# Altium footprint library conn_others.PcbLib: 26 footprints (part 1 of 2)
Each footprint in its own frame and in the unit in brackets; x right, y up, seen from the top. Pads: shape width x height; smd on the part's side, far side on the other; paste and mask are expansions set on the pad; w line width, h text height; cw(c..) or ccw(c..) is an arc to the next point about the centre after c.
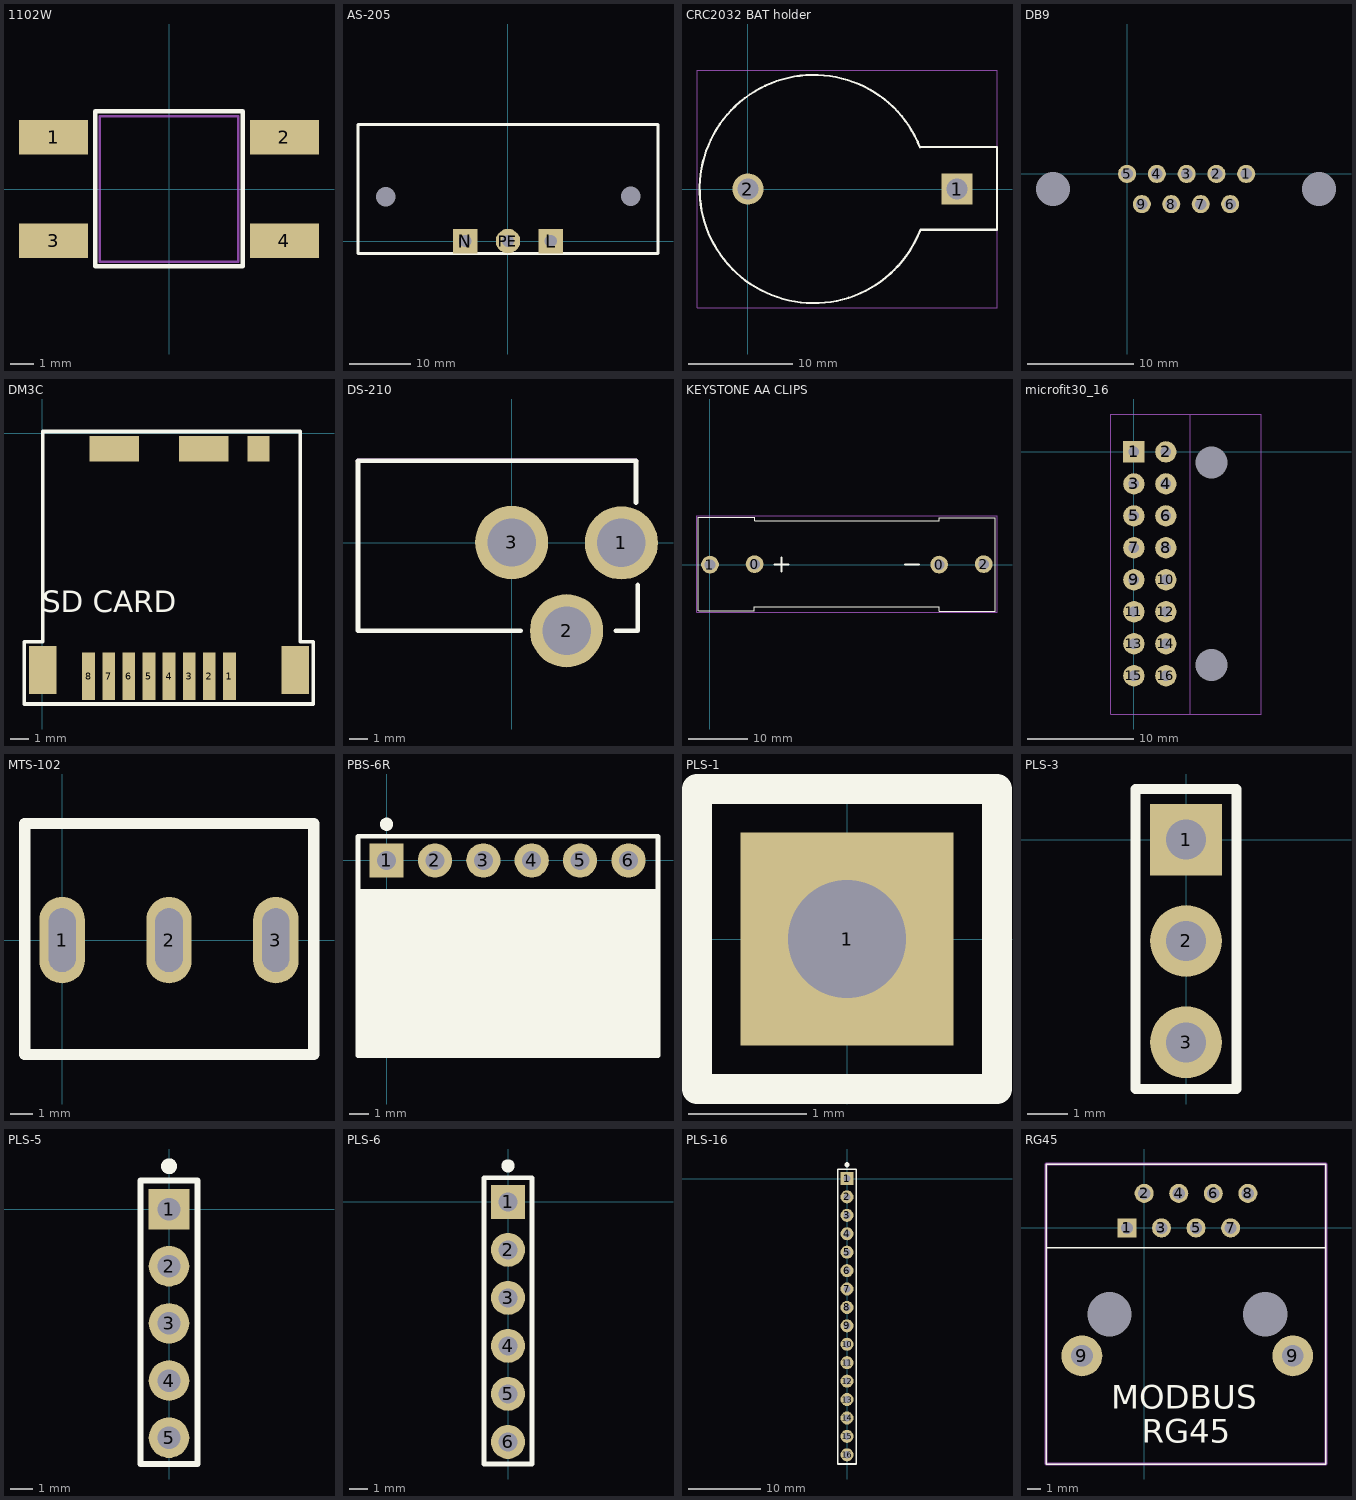
[diagram p0: the footprints below, top view; thin cyan lines are the x and y axes]

## 1102W [mm]
height 6
pads (4):
  rect 3x1.5 smd: 1(-5,2.25) 2(5,2.25) 3(-5,-2.25) 4(5,-2.25)
Top Overlay:
  lines w0.2: -3.2,-3.35 3.2,-3.35 3.2,3.375 -3.2,3.375 -3.2,-3.35
Mechanical 15:
  lines w0.1: -3,-3.15 3,-3.15 3,3.15 -3,3.15 -3,-3.15
3D body "TACT SMD 6X6.step": height 5, standoff 0, extent -5,-3 5,3

## AS-205 [mm]
height 30
pads (5):
  rect 4x4 hole 2: L(7,0) N(-7,0)
  round 0 hole 3.2 unplated mask+1.7: NPTH(-19.983,7.264) NPTH(20.022,7.289)
  round 4 hole 2: PE(0,0)
Top Overlay:
  lines w0.5: -24.5,-2 -24.5,19 24.5,19 24.5,-2 -24.5,-2
3D body "AS-205.STEP": height 26.8, standoff -3.8, extent -24.5,-2 24.5,19

## CRC2032 BAT holder [mm]
pads (2):
  rect 3x3 hole 2: 1(20,0)
  round 3 hole 2: 2(0,0)
Top Overlay:
  lines w0.2: 16.466,3.987 ccw(c6.3,0) 16.5,-3.9 23.825,-3.9 23.825,4 16.5,4
Mechanical 29:
  lines w0.1: -4.875,-11.375 -4.875,11.375 23.825,11.375 23.825,-11.375 -4.875,-11.375
  text ".Designator" at 4.3,5.4 h1
3D body "CR 2032 Battery Holder.step": height 6.55, standoff -4, extent -4.875,-11.375 23.825,11.375

## DB9 [mm] "разьем COM232"
pads (11):
  round 1.7 hole 1.1: 1(11.2,0) 2(8.4,0) 3(5.6,0) 4(2.8,0) 5(0,0) 6(9.695,-2.84) 7(6.925,-2.84) 8(4.155,-2.84) 9(1.385,-2.84)
  round 0 hole 3.2 unplated mask+1.7: NPTH(-6.96,-1.42) NPTH(18.04,-1.42)
3D body "db9f-2.step": height 13.28, standoff -3.15, extent -9.791,-16.867 21.009,1.533

## DM3C [mm] "Держатель карты MicroSD на плату"
height 1
pads (13):
  rect 0.7x2.6 smd: 1(10.222,-13.288) 2(9.122,-13.288) 3(8.022,-13.288) 4(6.922,-13.288) 5(5.822,-13.288) 6(4.722,-13.288) 7(3.622,-13.288) 8(2.522,-13.288)
  rect 1.5x2.6 smd: ""(0.019,-12.942) ""(13.819,-12.942)
  rect 2.7x1.4 smd: ""(3.919,-0.842) ""(8.819,-0.842)
  rect 1.2x1.4 smd: ""(11.819,-0.842)
Top Overlay:
  lines w0.2: -1,-14.8 -1,-11.4 ; -0.983,-14.8 14.8,-14.8 14.8,-11.4 14.1,-11.4 14.1,0.1 0.019,0.1 0.019,-11.4 ; -0.983,-11.4 0,-11.4
  text "SD CARD" at 0,-10.16 h2
3D body "31785.stp": height 1.98, standoff 0.05, extent 0.3,-14.4 14.1,-0.3

## DS-210 [mm]
pads (3):
  round 4 hole 2.65: 1(6,0) 2(3,-4.8) 3(0,0.025)
Top Overlay:
  lines w0.254: 0.5,-4.8 -8.4,-4.8 -8.4,4.5 6.8,4.5 6.8,2.2 ; 5.7,-4.8 6.9,-4.8 6.9,-2.3
Mechanical 29:
  lines w0.25: -8.4,4.5 6.8,4.5
3D body "PowerJackFemale.STEP": height 11, standoff -3.5, extent -8.55,-4.756 6.75,4.6

## KEYSTONE AA CLIPS [mm]
pads (4):
  round 3 hole 1.8: 0(7.55,0.081) 0(38.8,0) 1(0,0) 2(46.35,0.081)
Top Overlay:
  lines w0.2: -1.964,-7.799 -1.964,8 7.6,8 7.6,7.4 38.8,7.4 38.8,7.9 48.3,7.9 48.3,-7.9 38.8,-7.9 38.8,-7.1 7.5,-7.1 7.5,-7.8 -1.9,-7.8
  lines w0.3: 10.9,0 13.3,0 ; 12.1,-1.2 12.1,1.2 ; 33,0 35.4,0
Mechanical 29:
  lines w0.1: -2.2,-8.1 48.6,-8.1 48.6,8.3 -2.2,8.3 -2.2,-8.1
  text ".Designator" at 18.8,0.7 h1.5
3D body "duracell ultra aa 1_5v mx 1500 lr6.step": height 17.25, standoff 2.75, extent -2,-7.101 48.25,7.4
3D body "AA batery clip keystone 2915 .step": height 16.69, standoff -4.02, extent -1.964,-7.799 7.55,7.961
3D body "AA batery clip keystone 2915 .step": height 16.69, standoff -4.02, extent 38.786,-7.88 48.3,7.88

## microfit30_16 [mm]
pads (18):
  round 0 hole 3 unplated: 0(7.29,-19.99) 0(7.29,-1.016)
  rect 2x2 hole 1: 1(0,0)
  round 2 hole 1: 2(3,0) 3(0,-3) 4(3,-3) 5(0,-6) 6(3,-6) 7(0,-9) 8(3,-9) 9(0,-12) 10(3,-12) 11(0,-15) 12(3,-15) 13(0,-18) 14(3,-18) 15(0,-21) 16(3,-21)
Mechanical 29:
  lines w0.1: 4.826,3.556 5.283,3.556 5.283,-24.594 5.817,-24.594 ; -2.159,-24.594 11.937,-24.594 11.937,3.556 -2.159,3.556 -2.159,-24.594
  text ".Designator" at 9.703,-0.127 h1.5
3D body "header-16 R PCB.stp": height 8.83, standoff -3.12, extent -0.303,-24.594 11.937,3.556

## MTS-102 [mm]
height 10
pads (3):
  oval 2x3.8 hole 1.2 slot 2.8 at 90 deg: 1(0,0) 2(4.7,0) 3(9.4,0)
Top Overlay:
  lines w0.5: -1.651,-5.029 -1.651,5.131 11.063,5.131 11.063,-5.029 -1.651,-5.029
3D body "toogle_switch.STEP": height 28.55, standoff -3.83, extent -1.651,-5.029 11.063,5.131

## PBS-6R [mm] "Розетка угловая на плату 2,54мм"
pads (6):
  rect 1.8x1.8 hole 1: 1(0,0)
  round 1.8 hole 1: 2(2.54,0) 3(5.08,0) 4(7.62,0) 5(10.16,0) 6(12.7,0)
Top Overlay:
  circle w0.5: c0,1.9 r0.1
  rectangle: -1.5,-10.25 14.25,-1.5
  lines w0.254: -1.5,-10.25 14.25,-10.25 14.25,1.27 -1.5,1.27 -1.5,-10.25
3D body "PBS-6R.STEP": height 2.77, standoff -3.2, extent -1.585,-10.253 14.235,0.247

## PLS-1 [mm]
pads (1):
  rect 1.8x1.8 hole 1: 1(0,0)
Top Overlay:
  lines w0.254: -1.27,-1.27 -1.27,1.27 1.27,1.27 1.27,-1.27 -1.27,-1.27
3D body "PLS-1.step": height 8.44, standoff -3, extent -1.27,-1.27 1.27,1.27

## PLS-3 [mm]
pads (3):
  rect 1.8x1.8 hole 1: 1(0,0)
  round 1.8 hole 1: 2(0,-2.54) 3(0,-5.08)
Top Overlay:
  lines w0.254: -1.27,-6.25 1.27,-6.25 1.27,1.27 -1.27,1.27 -1.27,-6.25
Mechanical 29:
  lines w0.2: -1.27,-6.25 -1.27,1.27 1.27,1.27 1.27,-6.25 -1.27,-6.25
  text ".Designator" at 1.829,-0.254 h1
3D body "PLS-1.step": height 8.44, standoff -3, extent -1.27,-6.35 1.27,-3.81
3D body "PLS-1.step": height 8.44, standoff -3, extent -1.27,-3.81 1.27,-1.27
3D body "PLS-1.step": height 8.44, standoff -3, extent -1.27,-1.27 1.27,1.27

## PLS-5 [mm]
pads (5):
  rect 1.8x1.8 hole 1: 1(0,0)
  round 1.8 hole 1: 2(0,-2.54) 3(0,-5.08) 4(0,-7.62) 5(0,-10.16)
Top Overlay:
  circle w0.5: c0,1.9 r0.1
  lines w0.254: -1.27,-11.33 1.27,-11.33 1.27,1.27 -1.27,1.27 -1.27,-11.325
3D body "PLS-1.step": height 8.44, standoff -3, extent -1.27,-6.35 1.27,-3.81
3D body "PLS-1.step": height 8.44, standoff -3, extent -1.27,-3.81 1.27,-1.27
3D body "PLS-1.step": height 8.44, standoff -3, extent -1.27,-1.27 1.27,1.27
3D body "PLS-1.step": height 8.44, standoff -3, extent -1.27,-8.89 1.27,-6.35
3D body "PLS-1.step": height 8.44, standoff -3, extent -1.27,-11.43 1.27,-8.89

## PLS-6 [mm]
pads (6):
  rect 1.8x1.8 hole 1: 1(0,0)
  round 1.8 hole 1: 2(0,-2.54) 3(0,-5.08) 4(0,-7.62) 5(0,-10.16) 6(0,-12.7)
Top Overlay:
  circle w0.5: c0,1.9 r0.1
  lines w0.254: -1.27,-13.87 1.27,-13.87 ; -1.27,-13.843 -1.27,1.27 1.27,1.27 1.27,-13.868
3D body "PLS-1.step": height 8.44, standoff -3, extent -1.27,-11.43 1.27,-8.89
3D body "PLS-1.step": height 8.44, standoff -3, extent -1.27,-8.89 1.27,-6.35
3D body "PLS-1.step": height 8.44, standoff -3, extent -1.27,-1.27 1.27,1.27
3D body "PLS-1.step": height 8.44, standoff -3, extent -1.27,-3.81 1.27,-1.27
3D body "PLS-1.step": height 8.44, standoff -3, extent -1.27,-6.35 1.27,-3.81
3D body "PLS-1.step": height 8.44, standoff -3, extent -1.27,-13.97 1.27,-11.43

## PLS-16 [mm]
pads (16):
  rect 1.8x1.8 hole 1: 1(0,0)
  round 1.8 hole 1: 2(0,-2.54) 3(0,-5.08) 4(0,-7.62) 5(0,-10.16) 6(0,-12.7) 7(0,-15.24) 8(0,-17.78) 9(0,-20.32) 10(0,-22.86) 11(0,-25.4) 12(0,-27.94) 13(0,-30.48) 14(0,-33.02) 15(0,-35.56) 16(0,-38.1)
Top Overlay:
  circle w0.5: c0,1.9 r0.1
  lines w0.254: -1.27,-39.37 -1.27,1.27 1.27,1.27 1.27,-39.37 -1.27,-39.37
3D body "PLS-1.step": height 8.44, standoff -3, extent -1.27,-36.83 1.27,-34.29
3D body "PLS-1.step": height 8.44, standoff -3, extent -1.27,-39.37 1.27,-36.83
3D body "PLS-1.step": height 8.44, standoff -3, extent -1.27,-34.29 1.27,-31.75
3D body "PLS-1.step": height 8.44, standoff -3, extent -1.27,-26.67 1.27,-24.13
3D body "PLS-1.step": height 8.44, standoff -3, extent -1.27,-29.21 1.27,-26.67
3D body "PLS-1.step": height 8.44, standoff -3, extent -1.27,-31.75 1.27,-29.21
3D body "PLS-1.step": height 8.44, standoff -3, extent -1.27,-24.13 1.27,-21.59
3D body "PLS-1.step": height 8.44, standoff -3, extent -1.27,-16.51 1.27,-13.97
3D body "PLS-1.step": height 8.44, standoff -3, extent -1.27,-19.05 1.27,-16.51
3D body "PLS-1.step": height 8.44, standoff -3, extent -1.27,-21.59 1.27,-19.05
3D body "PLS-1.step": height 8.44, standoff -3, extent -1.27,-11.43 1.27,-8.89
3D body "PLS-1.step": height 8.44, standoff -3, extent -1.27,-8.89 1.27,-6.35
3D body "PLS-1.step": height 8.44, standoff -3, extent -1.27,-1.27 1.27,1.27
3D body "PLS-1.step": height 8.44, standoff -3, extent -1.27,-3.81 1.27,-1.27
3D body "PLS-1.step": height 8.44, standoff -3, extent -1.27,-6.35 1.27,-3.81
3D body "PLS-1.step": height 8.44, standoff -3, extent -1.27,-13.97 1.27,-11.43

## RG45 [mm] "Розетка на плату"
pads (12):
  round 0 hole 3.25: 0(-2.54,-6.35) 0(8.89,-6.35)
  rect 1.4x1.4 hole 0.9: 1(-1.27,0)
  round 1.4 hole 0.9: 2(0,2.54) 3(1.27,0) 4(2.54,2.54) 5(3.81,0) 6(5.08,2.54) 7(6.35,0) 8(7.62,2.54)
  round 3 hole 1.6: 9(-4.575,-9.4) 9(10.925,-9.4)
Top Overlay:
  lines w0.1: -7.214,-1.473 13.36,-1.473 ; -7.214,-17.348 13.36,-17.348 13.36,4.699 -7.214,4.699 -7.214,-17.348
  text "RG45" at -0.178,-16.383 h3
  text "MODBUS" at -2.413,-13.894 h3
Mechanical 29:
  lines w0.2: -7.214,-17.348 -7.214,4.699 13.36,4.699 13.36,-17.348 -7.214,-17.348
  text ".Designator" at -1.27,-3.81 h2
3D body "RG45-1.stp": height 15.85, standoff -3.08, extent -7.095,-17.272 13.185,4.568